# Altium footprint library CONN_W2B.PcbLib: 60 footprints (part 1 of 4)
Each footprint in its own frame and in the unit in brackets; x right, y up, seen from the top. Pads: shape width x height; smd on the part's side, far side on the other; paste and mask are expansions set on the pad; w line width, h text height; cw(c..) or ccw(c..) is an arc to the next point about the centre after c.
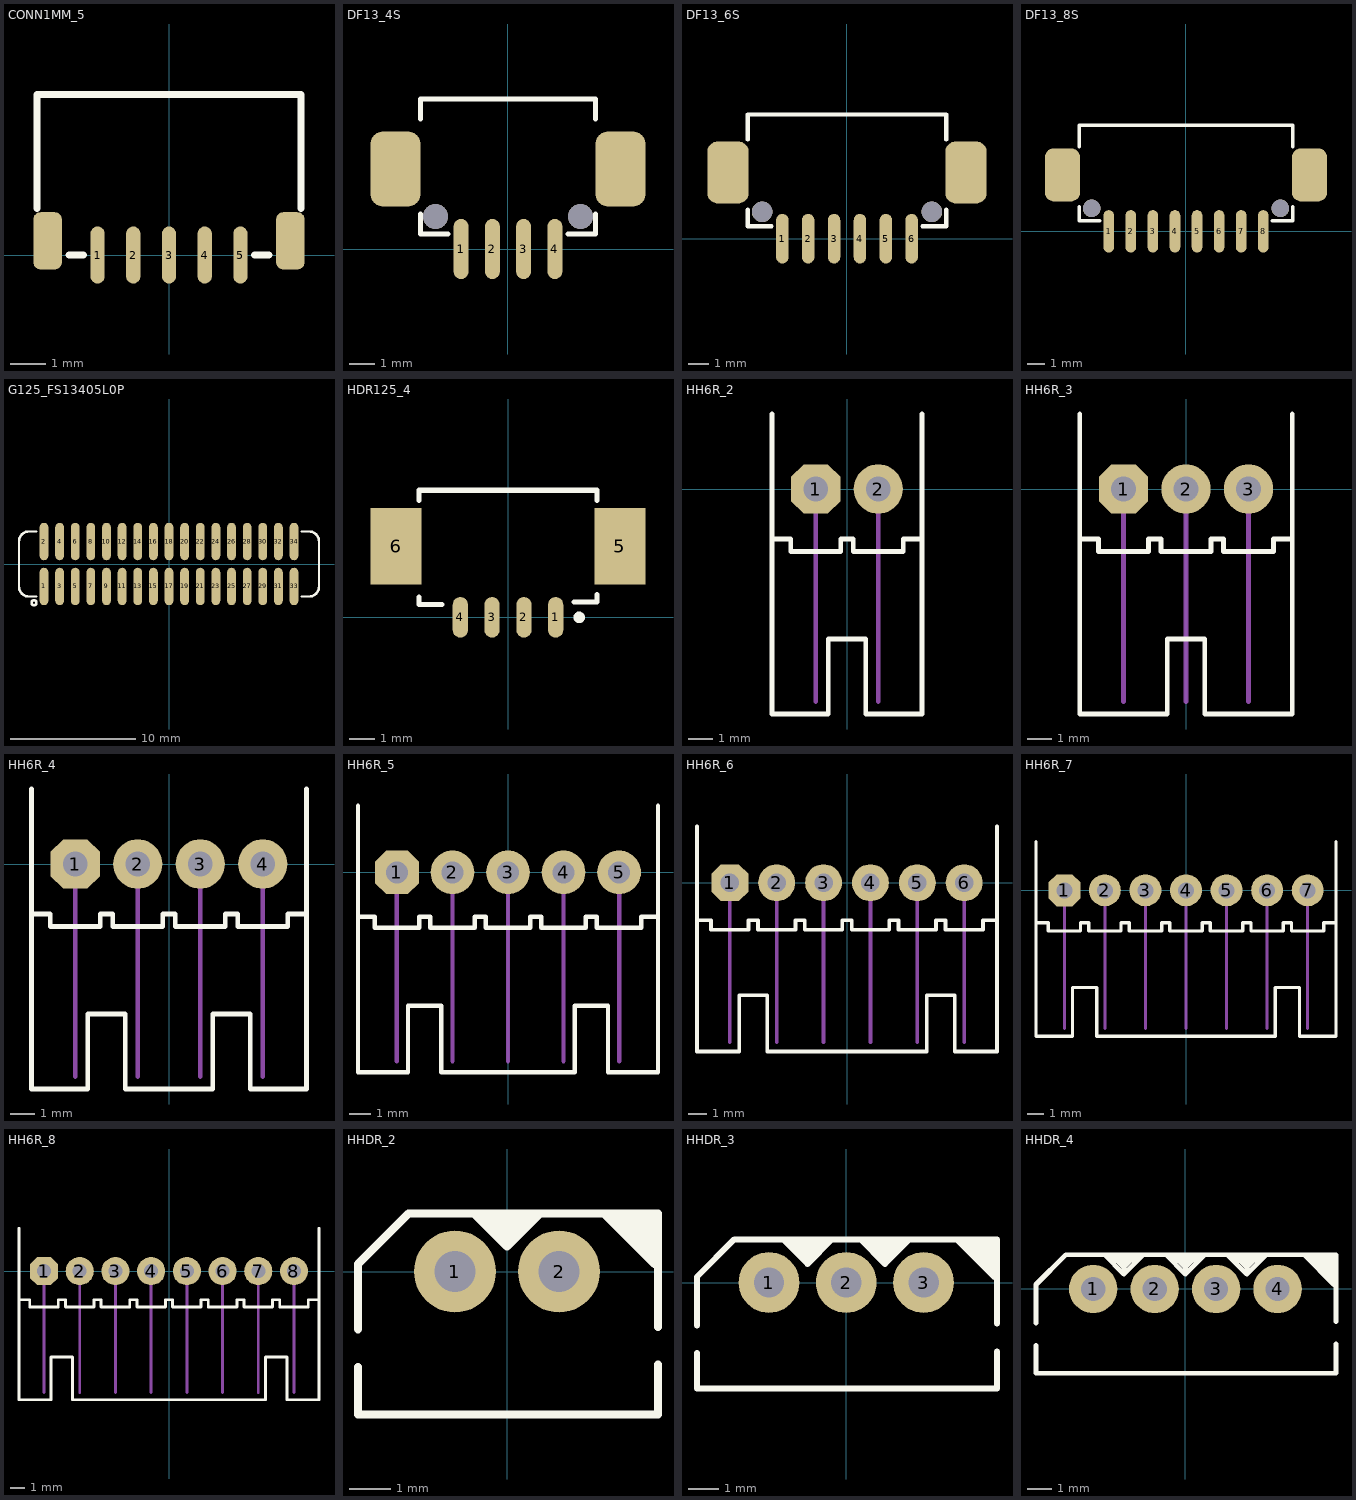
[diagram p0: the footprints below, top view; thin cyan lines are the x and y axes]

## CONN1MM_5 [mm] "CONN, 1mm, SMT RA, TE 1734709-5"
height 3
pads (7):
  oval 0.4x1.6 smd: 1(-2,0) 2(-1,0) 3(0,0) 4(1,0) 5(2,0)
  rrect50% 0.8x1.6 smd: ""(-3.4,0.4) ""(3.4,0.4)
Top Overlay:
  lines w0.2: -3.7,1.3 -3.7,4.5 3.7,4.5 3.7,1.3 ; -2.8,0 -2.4,0 ; 2.4,0 2.8,0
3D body "c-1734709-5-b-3d.stp": height 2.95, standoff 0, extent -3.65,-0.55 3.65,4.4

## DF13_4S [mm] "Hirose Connector DF13-4P-1.25H, DF13 4WAY pitch:1.25mm"
height 3
pads (8):
  oval 0.6x2.4 smd: 1(-1.875,0) 2(-0.625,0) 3(0.625,0) 4(1.875,0)
  rrect50% 2x3 smd: ""(-4.5,3.2) ""(4.5,3.2)
  round 1 hole 1 unplated: ""(-2.9,1.3) ""(2.9,1.3)
Top Overlay:
  lines w0.2: -3.5,1.4 -3.5,0.6 -2.4,0.6 ; -3.5,5.2 -3.5,6 3.5,6 3.5,5.2 ; 2.4,0.6 3.5,0.6 3.5,1.4
3D body "DF13_4WAY.stp": height 3.58, standoff -0.82, extent -4.825,-0.6 4.825,5.9

## DF13_6S [mm] "Hirose Connector DF13-6P-1.25H, DF13 6WAY pitch:1.25mm"
height 3
pads (10):
  oval 0.6x2.4 smd: 1(-3.125,0) 2(-1.875,0) 3(-0.625,0) 4(0.625,0) 5(1.875,0) 6(3.125,0)
  rrect50% 2x3 smd: ""(-5.75,3.2) ""(5.75,3.2)
  round 1 hole 1 unplated: ""(-4.1,1.3) ""(4.1,1.3)
Top Overlay:
  lines w0.2: -4.8,1.4 -4.8,0.6 -3.65,0.6 ; -4.8,4.8 -4.8,6 4.8,6 4.8,4.8 ; 3.65,0.6 4.8,0.6 4.8,1.4
3D body "DF13_6WAY.stp": height 3.58, standoff -0.82, extent -6.075,-0.6 6.075,5.9

## DF13_8S [mm] "Hirose Connector DF13-8P-1.25H, DF13 6WAY pitch:1.25mm"
height 3
pads (12):
  oval 0.6x2.4 smd: 1(-4.375,0) 2(-3.125,0) 3(-1.875,0) 4(-0.625,0) 5(0.625,0) 6(1.875,0) 7(3.125,0) 8(4.375,0)
  rrect50% 2x3 smd: ""(-7,3.2) ""(7,3.2)
  round 1 hole 1 unplated: ""(-5.35,1.3) ""(5.35,1.3)
Top Overlay:
  lines w0.2: -6.05,1.4 -6.05,0.6 -4.9,0.6 ; -6.05,4.8 -6.05,6 6.05,6 6.05,4.8 ; 4.9,0.6 6.05,0.6 6.05,1.4
3D body "DF13-8P-1.25H.stp": height 3.58, standoff -0.82, extent -7.325,-0.6 7.325,5.9

## G125_FS13405L0P [mm] "G125-FS13405L0P Harwin Gecko 1.25mm Female"
pads (34):
  oval 0.7x3 smd: 1(-10,-1.8) 2(-10,1.8) 3(-8.75,-1.8) 4(-8.75,1.8) 5(-7.5,-1.8) 6(-7.5,1.8) 7(-6.25,-1.8) 8(-6.25,1.8) 9(-5,-1.8) 10(-5,1.8) 11(-3.75,-1.8) 12(-3.75,1.8) 13(-2.5,-1.8) 14(-2.5,1.8) 15(-1.25,-1.8) 16(-1.25,1.8) 17(0,-1.8) 18(0,1.8) 19(1.25,-1.8) 20(1.25,1.8) 21(2.5,-1.8) 22(2.5,1.8) 23(3.75,-1.8) 24(3.75,1.8) 25(5,-1.8) 26(5,1.8) 27(6.25,-1.8) 28(6.25,1.8) 29(7.5,-1.8) 30(7.5,1.8) 31(8.75,-1.8) 32(8.75,1.8) 33(10,-1.8) 34(10,1.8)
Top Overlay:
  circle w0.2: c-10.8,-3.1 r0.2
  lines w0.2: -10.6,-2.6 -11.2,-2.6 cw(c-11.2,-1.8) -12,-1.8 -12,1.8 cw(c-11.2,1.8) -11.2,2.6 -10.6,2.6 ; 10.6,-2.6 11.2,-2.6 ccw(c11.2,-1.8) 12,-1.8 12,1.8 ccw(c11.2,1.8) 11.2,2.6 10.6,2.6
3D body "g125-fs13405l0_asm.stp": height 5.3, standoff -0.03, extent -11.9,-2.897 11.9,2.897

## HDR125_4 [mm] "CONN, HEADER, 1.25mm PITCH, MOLEX PicoBlade 0532610471"
pads (6):
  oval 0.6x1.6 smd: 1(1.875,0) 2(0.625,0) 3(-0.625,0) 4(-1.875,0)
  rect 2x3 smd: 5(4.4,2.8) 6(-4.4,2.8)
Top Overlay:
  circle w0.254: c2.8,0 r0.1
  lines w0.2: -3.5,0.8 -3.5,0.5 -2.6,0.5 ; -3.5,4.6 -3.5,5 3.5,5 3.5,4.6 ; 2.6,0.6 3.5,0.6 3.5,0.9
Mechanical 29:
  text ".Designator" at 3.6,-2.2 h1.52
3D body "532610471.stp": height 3.39, standoff -0.01, extent -5.075,-0.3 5.075,4.9

## HH6R_2 [mm]
pads (2):
  oct 2x2 hole 1: 1(-1.27,0)
  round 2 hole 1: 2(1.27,0)
Top Overlay:
  lines w0.2: -3.048,3.048 -3.048,-2.032 ; 3.048,3.048 3.048,-2.032 ; -3.048,-2.032 -3.048,-9.144 -0.762,-9.144 -0.762,-6.096 0.762,-6.096 0.762,-9.144 3.048,-9.144 3.048,-2.032 ; -3.048,-2.032 -2.286,-2.032 -2.286,-2.54 -0.254,-2.54 -0.254,-2.032 0.254,-2.032 0.254,-2.54 2.286,-2.54 2.286,-2.032 3.048,-2.032
Mechanical 5:
  lines w0.2: -1.27,-8.636 -1.27,0 ; 1.27,-8.636 1.27,0

## HH6R_3 [mm]
pads (3):
  oct 2x2 hole 1: 1(-2.54,0)
  round 2 hole 1: 2(0,0) 3(2.54,0)
Top Overlay:
  lines w0.2: -4.318,3.048 -4.318,-2.032 ; 4.318,3.048 4.318,-2.032 ; -4.318,-2.032 -3.556,-2.032 -3.556,-2.54 -1.524,-2.54 -1.524,-2.032 -1.016,-2.032 -1.016,-2.54 1.016,-2.54 1.016,-2.032 1.524,-2.032 1.524,-2.54 3.556,-2.54 3.556,-2.032 4.318,-2.032 ; -4.318,-2.032 -4.318,-9.144 -0.762,-9.144 -0.762,-6.096 0.762,-6.096 0.762,-9.144 4.318,-9.144 4.318,-2.032
Mechanical 5:
  lines w0.2: -2.54,-8.636 -2.54,0 ; 0,-8.636 0,0 ; 2.54,-8.636 2.54,0

## HH6R_4 [mm]
pads (4):
  oct 2x2 hole 1: 1(-3.81,0)
  round 2 hole 1: 2(-1.27,0) 3(1.27,0) 4(3.81,0)
Top Overlay:
  lines w0.2: -5.588,3.048 -5.588,-2.032 ; 5.588,3.048 5.588,-2.032 ; -5.588,-2.032 -4.826,-2.032 -4.826,-2.54 -2.794,-2.54 -2.794,-2.032 -2.286,-2.032 -2.286,-2.54 -0.254,-2.54 -0.254,-2.032 0.254,-2.032 0.254,-2.54 2.286,-2.54 2.286,-2.032 2.794,-2.032 2.794,-2.54 4.826,-2.54 4.826,-2.032 5.588,-2.032 ; -5.588,-2.032 -5.588,-9.144 -3.302,-9.144 -3.302,-6.096 -1.778,-6.096 -1.778,-9.144 1.778,-9.144 1.778,-6.096 3.302,-6.096 3.302,-9.144 5.588,-9.144 5.588,-2.032
Mechanical 5:
  lines w0.2: -3.81,-8.636 -3.81,0 ; -1.27,-8.636 -1.27,0 ; 1.27,-8.636 1.27,0 ; 3.81,-8.636 3.81,0

## HH6R_5 [mm]
pads (5):
  oct 2x2 hole 1: 1(-5.08,0)
  round 2 hole 1: 2(-2.54,0) 3(0,0) 4(2.54,0) 5(5.08,0)
Top Overlay:
  lines w0.2: -6.858,3.048 -6.858,-2.032 ; 6.858,3.048 6.858,-2.032 ; -6.858,-2.032 -6.858,-9.144 -4.572,-9.144 -4.572,-6.096 -3.048,-6.096 -3.048,-9.144 3.048,-9.144 3.048,-6.096 4.572,-6.096 4.572,-9.144 6.858,-9.144 6.858,-2.032 ; -6.858,-2.032 -6.096,-2.032 -6.096,-2.54 -4.064,-2.54 -4.064,-2.032 -3.556,-2.032 -3.556,-2.54 -1.524,-2.54 -1.524,-2.032 -1.016,-2.032 -1.016,-2.54 1.016,-2.54 1.016,-2.032 1.524,-2.032 1.524,-2.54 3.556,-2.54 3.556,-2.032 4.064,-2.032 4.064,-2.54 6.096,-2.54 6.096,-2.032 6.858,-2.032
Mechanical 5:
  lines w0.2: -5.08,-8.636 -5.08,0 ; -2.54,-8.636 -2.54,0 ; 0,-8.636 0,0 ; 2.54,-8.636 2.54,0 ; 5.08,-8.636 5.08,0

## HH6R_6 [mm]
pads (6):
  oct 2x2 hole 1: 1(-6.35,0)
  round 2 hole 1: 2(-3.81,0) 3(-1.27,0) 4(1.27,0) 5(3.81,0) 6(6.35,0)
Top Overlay:
  lines w0.2: -8.128,3.048 -8.128,-2.032 ; 8.128,3.048 8.128,-2.032 ; -8.128,-2.032 -8.128,-9.144 -5.842,-9.144 -5.842,-6.096 -4.318,-6.096 -4.318,-9.144 4.318,-9.144 4.318,-6.096 5.842,-6.096 5.842,-9.144 8.128,-9.144 8.128,-2.032 ; -8.128,-2.032 -7.366,-2.032 -7.366,-2.54 -5.334,-2.54 -5.334,-2.032 -4.826,-2.032 -4.826,-2.54 -2.794,-2.54 -2.794,-2.032 -2.286,-2.032 -2.286,-2.54 -0.254,-2.54 -0.254,-2.032 0.254,-2.032 0.254,-2.54 2.286,-2.54 2.286,-2.032 2.794,-2.032 2.794,-2.54 4.826,-2.54 4.826,-2.032 5.334,-2.032 5.334,-2.54 7.366,-2.54 7.366,-2.032 8.128,-2.032
Mechanical 5:
  lines w0.2: -6.35,-8.636 -6.35,0 ; -3.81,-8.636 -3.81,0 ; -1.27,-8.636 -1.27,0 ; 1.27,-8.636 1.27,0 ; 3.81,-8.636 3.81,0 ; 6.35,-8.636 6.35,0

## HH6R_7 [mm]
pads (7):
  oct 2x2 hole 1: 1(-7.62,0)
  round 2 hole 1: 2(-5.08,0) 3(-2.54,0) 4(0,0) 5(2.54,0) 6(5.08,0) 7(7.62,0)
Top Overlay:
  lines w0.2: -9.398,3.048 -9.398,-2.032 ; 9.398,3.048 9.398,-2.032 ; -9.398,-2.032 -9.398,-9.144 -7.112,-9.144 -7.112,-6.096 -5.588,-6.096 -5.588,-9.144 5.588,-9.144 5.588,-6.096 7.112,-6.096 7.112,-9.144 9.398,-9.144 9.398,-2.032 ; -9.398,-2.032 -8.636,-2.032 -8.636,-2.54 -6.604,-2.54 -6.604,-2.032 -6.096,-2.032 -6.096,-2.54 -4.064,-2.54 -4.064,-2.032 -3.556,-2.032 -3.556,-2.54 -1.524,-2.54 -1.524,-2.032 -1.016,-2.032 -1.016,-2.54 1.016,-2.54 1.016,-2.032 1.524,-2.032 1.524,-2.54 3.556,-2.54 3.556,-2.032 4.064,-2.032 4.064,-2.54 6.096,-2.54 6.096,-2.032 6.604,-2.032 6.604,-2.54 8.636,-2.54 8.636,-2.032 9.398,-2.032
Mechanical 5:
  lines w0.2: -7.62,-8.636 -7.62,0 ; -5.08,-8.636 -5.08,0 ; -2.54,-8.636 -2.54,0 ; 0,-8.636 0,0 ; 2.54,-8.636 2.54,0 ; 5.08,-8.636 5.08,0 ; 7.62,-8.636 7.62,0

## HH6R_8 [mm]
pads (8):
  oct 2x2 hole 1: 1(-8.89,0)
  round 2 hole 1: 2(-6.35,0) 3(-3.81,0) 4(-1.27,0) 5(1.27,0) 6(3.81,0) 7(6.35,0) 8(8.89,0)
Top Overlay:
  lines w0.2: -10.668,3.048 -10.668,-2.032 ; 10.668,3.048 10.668,-2.032 ; -10.668,-2.032 -9.906,-2.032 -9.906,-2.54 -7.874,-2.54 -7.874,-2.032 -7.366,-2.032 -7.366,-2.54 -5.334,-2.54 -5.334,-2.032 -4.826,-2.032 -4.826,-2.54 -2.794,-2.54 -2.794,-2.032 -2.286,-2.032 -2.286,-2.54 -0.254,-2.54 -0.254,-2.032 0.254,-2.032 0.254,-2.54 2.286,-2.54 2.286,-2.032 2.794,-2.032 2.794,-2.54 4.826,-2.54 4.826,-2.032 5.334,-2.032 5.334,-2.54 7.366,-2.54 7.366,-2.032 7.874,-2.032 7.874,-2.54 9.906,-2.54 9.906,-2.032 10.668,-2.032 ; -10.668,-2.032 -10.668,-9.144 -8.382,-9.144 -8.382,-6.096 -6.858,-6.096 -6.858,-9.144 6.858,-9.144 6.858,-6.096 8.382,-6.096 8.382,-9.144 10.668,-9.144 10.668,-2.032
Mechanical 5:
  lines w0.2: -8.89,-8.636 -8.89,0 ; -6.35,-8.636 -6.35,0 ; -3.81,-8.636 -3.81,0 ; -1.27,-8.636 -1.27,0 ; 1.27,-8.636 1.27,0 ; 3.81,-8.636 3.81,0 ; 6.35,-8.636 6.35,0 ; 8.89,-8.636 8.89,0

## HHDR_2 [mm]
pads (2):
  round 2 hole 1: 1(-1.27,0) 2(1.27,0)
Top Overlay:
  lines w0.2: -3.635,-2.325 -3.635,-3.485 3.683,-3.485 3.683,-2.269 ; -3.635,-1.405 -3.635,0.185 -2.405,1.415 3.683,1.415 3.683,-1.349 ; -0.8,1.415 0,0.615 ; -0.526,1.415 0,0.889 0.526,1.415 ; -0.272,1.415 0,1.143 0.272,1.415 ; 0,1.415 0,0.615 ; 0.8,1.415 0,0.615 ; 2.365,1.415 3.595,0.185 ; 2.579,1.415 3.595,0.399 3.595,0.653 2.833,1.415 3.087,1.415 3.595,0.907 3.595,1.161 3.341,1.415

## HHDR_3 [mm]
pads (3):
  round 2 hole 1: 1(-2.54,0) 2(0,0) 3(2.54,0)
Top Overlay:
  lines w0.2: -4.905,-2.325 -4.905,-3.485 4.953,-3.485 4.953,-2.269 ; -4.905,-1.405 -4.905,0.185 -3.675,1.415 4.953,1.415 4.953,-1.349 ; -2.07,1.415 -1.27,0.615 ; -1.796,1.415 -1.27,0.889 -0.744,1.415 ; -1.542,1.415 -1.27,1.143 -0.998,1.415 ; -1.27,1.415 -1.27,0.615 ; -0.47,1.415 -1.27,0.615 ; 0.47,1.415 1.27,0.615 ; 0.744,1.415 1.27,0.889 1.796,1.415 ; 0.998,1.415 1.27,1.143 1.542,1.415 ; 1.27,1.415 1.27,0.615 ; 2.07,1.415 1.27,0.615 ; 3.635,1.415 4.865,0.185 ; 3.849,1.415 4.865,0.399 4.865,0.653 4.103,1.415 4.357,1.415 4.865,0.907 4.865,1.161 4.611,1.415

## HHDR_4 [mm]
pads (4):
  round 2 hole 1: 1(-3.81,0) 2(-1.27,0) 3(1.27,0) 4(3.81,0)
Top Overlay:
  lines w0.2: -6.175,-2.325 -6.175,-3.485 6.223,-3.485 6.223,-2.269 ; -6.175,-1.405 -6.175,0.185 -4.945,1.415 6.223,1.415 6.223,-1.349 ; -3.34,1.415 -2.54,0.615 ; -3.066,1.415 -2.54,0.889 -2.014,1.415 ; -2.812,1.415 -2.54,1.143 -2.268,1.415 ; -2.54,1.415 -2.54,0.615 ; -1.74,1.415 -2.54,0.615 ; -0.8,1.415 0,0.615 ; -0.526,1.415 0,0.889 0.526,1.415 ; -0.272,1.415 0,1.143 0.272,1.415 ; 0,1.415 0,0.615 ; 0.8,1.415 0,0.615 ; 1.74,1.415 2.54,0.615 ; 2.014,1.415 2.54,0.889 3.066,1.415 ; 2.268,1.415 2.54,1.143 2.812,1.415 ; 2.54,1.415 2.54,0.615 ; 3.34,1.415 2.54,0.615 ; 4.905,1.415 6.135,0.185 ; 5.119,1.415 6.135,0.399 6.135,0.653 5.373,1.415 5.627,1.415 6.135,0.907 6.135,1.161 5.881,1.415